# Altium footprint library intrgrat_lib.PcbLib: 65 footprints (part 5 of 5)
Each footprint in its own frame and in the unit in brackets; x right, y up, seen from the top. Pads: shape width x height; smd on the part's side, far side on the other; paste and mask are expansions set on the pad; w line width, h text height; cw(c..) or ccw(c..) is an arc to the next point about the centre after c.
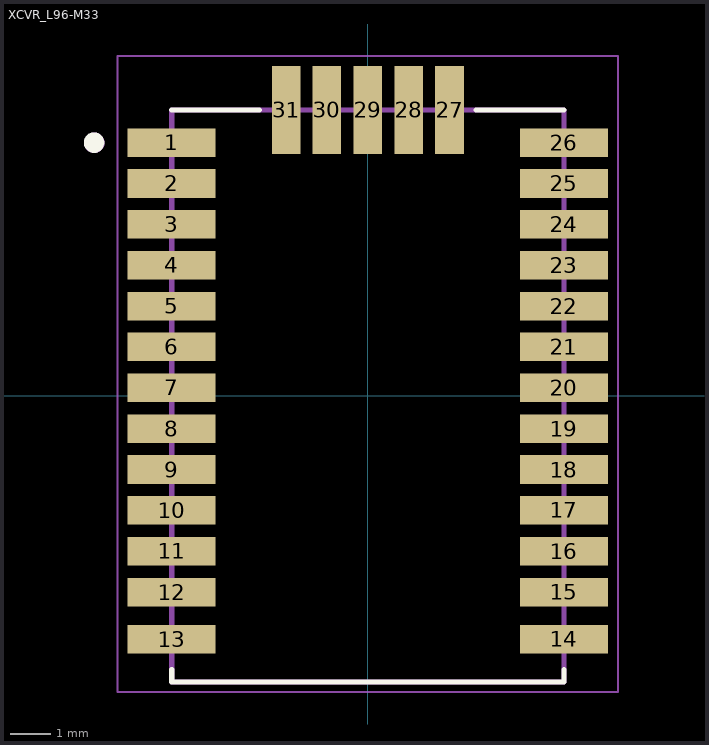
[diagram p4: the footprint, top view; thin cyan lines are the x and y axes]

## XCVR_L96-M33 [mm]
pads (31):
  rect 2.15x0.7 smd: 1(-4.8,6.2) 2(-4.8,5.2) 3(-4.8,4.2) 4(-4.8,3.2) 5(-4.8,2.2) 6(-4.8,1.2) 7(-4.8,0.2) 8(-4.8,-0.8) 9(-4.8,-1.8) 10(-4.8,-2.8) 11(-4.8,-3.8) 12(-4.8,-4.8) 13(-4.8,-5.95) 14(4.8,-5.95) 15(4.8,-4.8) 16(4.8,-3.8) 17(4.8,-2.8) 18(4.8,-1.8) 19(4.8,-0.8) 20(4.8,0.2) 21(4.8,1.2) 22(4.8,2.2) 23(4.8,3.2) 24(4.8,4.2) 25(4.8,5.2) 26(4.8,6.2)
  rect 0.7x2.15 smd: 27(2,7) 28(1,7) 29(0,7) 30(-1,7) 31(-2,7)
Top Overlay:
  circle w0.3: c-6.7,6.2 r0.1
  lines w0.127: -4.8,-6.7 -4.8,-7 4.8,-7 4.8,-6.7 ; -4.8,7 -2.65,7 ; 2.65,7 4.8,7
Mechanical 13:
  circle w0.3: c-6.693,6.196 r0.1
  lines w0.127: -4.8,-7 -4.8,7 4.8,7 4.8,-7 -4.8,-7
Mechanical 15:
  lines w0.05: -6.125,-7.25 -6.125,8.325 6.125,8.325 6.125,-7.25 -6.125,-7.25
3D body "L96-M33--3DModel-STEP-56544.STEP": height 2.2, standoff 0, extent -4.826,-7 4.774,7